# Altium footprint library PcbLib1.PcbLib: 48 footprints (part 1 of 3)
Each footprint in its own frame and in the unit in brackets; x right, y up, seen from the top. Pads: shape width x height; smd on the part's side, far side on the other; paste and mask are expansions set on the pad; w line width, h text height; cw(c..) or ccw(c..) is an arc to the next point about the centre after c.
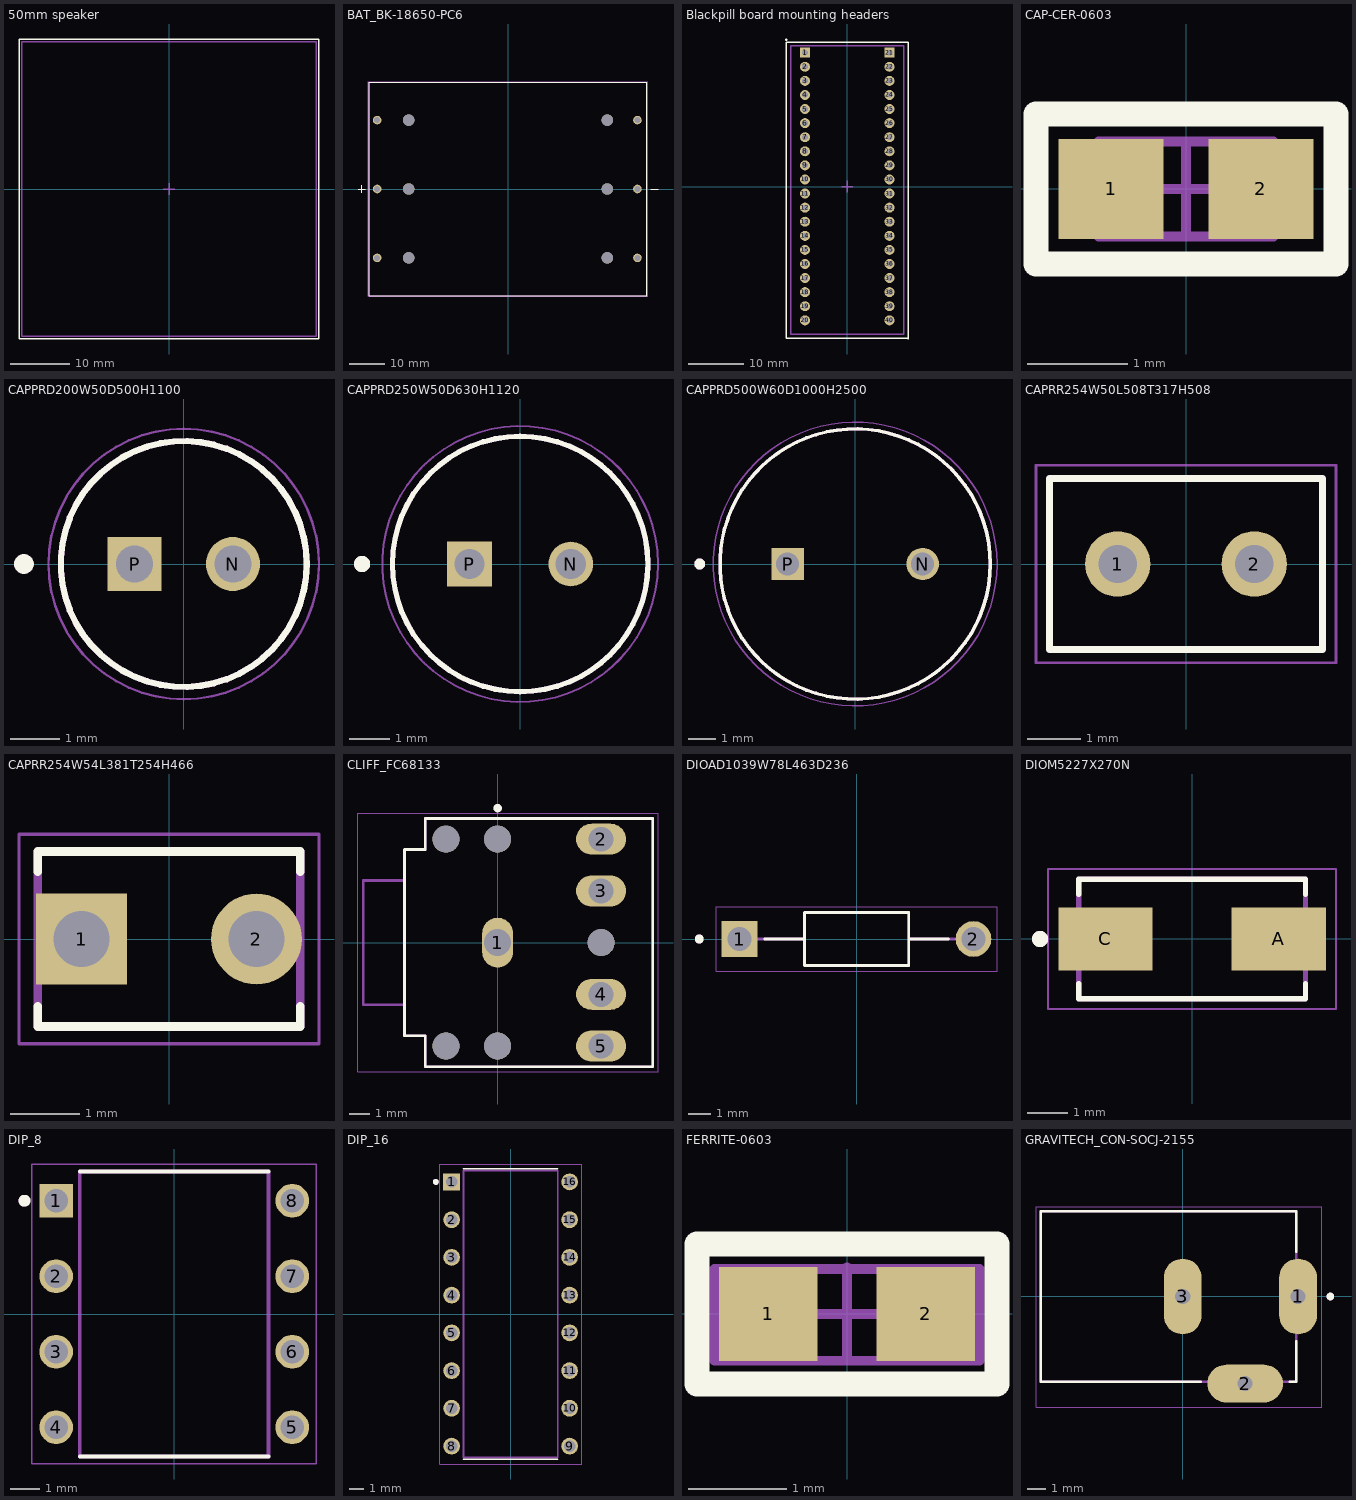
[diagram p0: the footprints below, top view; thin cyan lines are the x and y axes]

## 50mm speaker [mm]
Top Overlay:
  lines w0.254: -25.5,-25.5 25.5,-25.5 25.5,25.5 -25.5,25.5 -25.5,-25.5
Top Courtyard:
  lines w0.254: -1,0 1,0 ; 0,-1 0,1
Top 3D Body:
  lines w0.254: -25,-25 -25,25 25,25 25,-25 -25,-25
3D body "Aiyima speaker 50mm, 40Ohm, 5W.STEP": height 22, standoff -1.5, extent -25,-25 25,25

## BAT_BK-18650-PC6 [mm]
pads (12):
  round 2.4 hole 1.6: 1+(-36.65,19.3) 1-(36.25,19.3) 2+(-36.65,0) 2-(36.25,0) 3+(-36.65,-19.3) 3-(36.25,-19.3)
  round 3.2 hole 3.2 unplated: ""(-27.805,-19.3) ""(-27.805,0) ""(-27.805,19.3) ""(27.805,-19.3) ""(27.805,0) ""(27.805,19.3)
Top Overlay:
  lines w0.127: -42,0 -40,0 ; -41,-1 -41,1 ; 40,0 42,0 ; -38.85,-29.845 38.85,-29.845 38.85,29.845 -38.85,29.845 -38.85,-29.845
Mechanical 13:
  lines w0.127: -42,0 -40,0 ; -41,-1 -41,1 ; 40,0 42,0 ; -38.85,-29.845 38.85,-29.845 38.85,29.845 -38.85,29.845 -38.85,-29.845
Mechanical 15:
  lines w0.05: -39.1,-30.095 39.1,-30.095 39.1,30.095 -39.1,30.095 -39.1,-30.095
3D body "BK-18650-PC6--3DModel-STEP-56544.STEP": height 21.74, standoff -3, extent -38.723,-29.845 38.977,29.845

## Blackpill board mounting headers [mm]
pads (40):
  rect 1.8x1.8 hole 1: 1(-7.62,24.13) 21(7.62,24.13)
  round 1.8 hole 1: 2(-7.62,21.59) 3(-7.62,19.05) 4(-7.62,16.51) 5(-7.62,13.97) 6(-7.62,11.43) 7(-7.62,8.89) 8(-7.62,6.35) 9(-7.62,3.81) 10(-7.62,1.27) 11(-7.62,-1.27) 12(-7.62,-3.81) 13(-7.62,-6.35) 14(-7.62,-8.89) 15(-7.62,-11.43) 16(-7.62,-13.97) 17(-7.62,-16.51) 18(-7.62,-19.05) 19(-7.62,-21.59) 20(-7.62,-24.13) 22(7.62,21.59) 23(7.62,19.05) 24(7.62,16.51) 25(7.62,13.97) 26(7.62,11.43) 27(7.62,8.89) 28(7.62,6.35) 29(7.62,3.81) 30(7.62,1.27) 31(7.62,-1.27) 32(7.62,-3.81) 33(7.62,-6.35) 34(7.62,-8.89) 35(7.62,-11.43) 36(7.62,-13.97) 37(7.62,-16.51) 38(7.62,-19.05) 39(7.62,-21.59) 40(7.62,-24.13)
Top Overlay:
  circle w0.254: c-11,26.5 r0.1
  lines w0.254: -11,-27.4 10.9,-27.4 11,-27.5 11,25.9 10.9,26 -11,26 -11,-27.4
Top Assembly:
  lines w0.254: -10.16,-26.67 10.16,-26.67 10.16,25.4 -10.16,25.4 -10.16,-26.67
Top Courtyard:
  lines w0.254: -1,0 1,0 ; 0,-1 0,1
3D body "PPPC101LFBNRC--3DModel-STEP-269445.STEP": height 8.51, standoff -3.2, extent 6.35,-25.654 8.89,0.254
3D body "PPPC101LFBNRC--3DModel-STEP-269445.STEP": height 8.51, standoff -3.2, extent 6.35,-0.254 8.89,25.654
3D body "PPPC101LFBNRC--3DModel-STEP-269445.STEP": height 8.51, standoff -3.2, extent -8.89,-25.654 -6.35,0.254
3D body "PPPC101LFBNRC--3DModel-STEP-269445.STEP": height 8.51, standoff -3.2, extent -8.89,-0.254 -6.35,25.654

## CAP-CER-0603 [mm] "Chip Capacitor, 2-Leads, Body 1.60x0.80mm, IPC Medium Density"
height 0.95
pads (2):
  rect 1.05x1 smd: 1(-0.75,0) 2(0.75,0)
Top Overlay:
  lines w0.254: -1.5,-0.75 -1.5,0.75 1.5,0.75 1.5,-0.75 -1.5,-0.75
Top Assembly:
  lines w0.1: -0.875,-0.475 0.875,-0.475 0.875,0.475 -0.875,0.475 -0.875,-0.475
Top Courtyard:
  lines w0.05: -1.5,-0.75 1.5,-0.75 1.5,0.75 -1.5,0.75 -1.5,-0.75
  lines w0.1: -0.475,0 0.475,0 ; 0,-0.475 0,0.475
3D body "CAP-CER-0603.step": height 0.95, standoff 0, extent -0.875,-0.475 0.875,0.475

## CAPPRD200W50D500H1100 [mm]
pads (2):
  round 1.1 hole 0.75: N(1,0)
  rect 1.1x1.1 hole 0.75: P(-1,0)
Top Overlay:
  circle w0.2: c-3.25,0 r0.1
  circle w0.127: c0,0 r2.5
Mechanical 13:
  circle w0.2: c-3.25,0 r0.1
  circle w0.127: c0,0 r2.5
Mechanical 15:
  circle w0.05: c0,0 r2.75
3D body "step_temp.STEP": height 11, standoff -17, extent -2.5,-2.498 2.5,2.498

## CAPPRD250W50D630H1120 [mm]
pads (2):
  round 1.1 hole 0.75: N(1.25,0)
  rect 1.1x1.1 hole 0.75: P(-1.25,0)
Top Overlay:
  circle w0.127: c0,0 r3.15
  circle w0.2: c-3.9,0 r0.1
Mechanical 13:
  circle w0.127: c0,0 r3.15
  circle w0.2: c-3.9,0 r0.1
Mechanical 15:
  circle w0.05: c0,0 r3.4
3D body "step_temp.STEP": height 11.2, standoff -17, extent -3.15,-3.149 3.15,3.149

## CAPPRD500W60D1000H2500 [mm]
pads (2):
  round 1.2 hole 0.85: N(2.5,0)
  rect 1.2x1.2 hole 0.85: P(-2.5,0)
Top Overlay:
  circle w0.127: c0,0 r5
  circle w0.2: c-5.75,0 r0.1
Mechanical 13:
  circle w0.127: c0,0 r5
  circle w0.2: c-5.75,0 r0.1
Mechanical 15:
  circle w0.05: c0,0 r5.25
3D body "step_temp.STEP": height 25, standoff -17, extent -5,-4.999 5,4.999

## CAPRR254W50L508T317H508 [mm]
height 5.08
pads (2):
  round 1.218 hole 0.71 mask+0.102: 1(-1.27,0) 2(1.27,0)
Top Overlay:
  lines w0.127: -2.54,-1.587 2.54,-1.587 2.54,1.587 -2.54,1.587 -2.54,-1.587
Mechanical 13:
  lines w0.127: -2.54,-1.587 2.54,-1.587 2.54,1.587 -2.54,1.587 -2.54,-1.587
Mechanical 15:
  lines w0.05: -2.79,-1.837 2.79,-1.837 2.79,1.837 -2.79,1.837 -2.79,-1.837
3D body "step_temp.STEP": height 5.08, standoff -25.4, extent -2.54,-1.587 2.54,1.587

## CAPRR254W54L381T254H466 [mm]
height 4.66
pads (2):
  rect 1.318x1.318 / inner round 1.318 / far side rect 1.318x1.318 hole 0.81: 1(-1.27,0)
  round 1.318 hole 0.81: 2(1.27,0)
Top Overlay:
  lines w0.127: -1.905,-0.979 -1.905,-1.27 1.905,-1.27 1.905,-0.979 ; -1.905,0.979 -1.905,1.27 1.905,1.27 1.905,0.979
Mechanical 13:
  lines w0.127: -1.905,-1.27 1.905,-1.27 1.905,1.27 -1.905,1.27 -1.905,-1.27
Mechanical 15:
  lines w0.05: -2.179,-1.52 2.179,-1.52 2.179,1.52 -2.179,1.52 -2.179,-1.52
3D body "step_temp.STEP": height 4.66, standoff -7, extent -1.905,-1.27 1.905,1.27

## CLIFF_FC68133 [mm]
height 5.2
pads (10):
  oval 1.5x2.416 hole 1.3 mask+0.102: 1(0,0)
  oval 2.416x1.5 hole 1.2 mask+0.102: 2(5,5) 3(5,2.5) 4(5,-2.5) 5(5,-5)
  round 1.3 hole 1.3 unplated mask+0: ""(-2.5,-5) ""(-2.5,5) ""(0,-5) ""(0,5) ""(5,0)
Top Overlay:
  circle w0.2: c0,6.5 r0.1
  lines w0.127: -4.5,-4.5 -3.5,-4.5 -3.5,-6 7.5,-6 7.5,6 -3.5,6 -3.5,4.5 -4.5,4.5 -4.5,-4.5
Mechanical 13:
  circle w0.2: c0,6.5 r0.1
  lines w0.127: -4.5,-3 -6.5,-3 -6.5,3 -4.5,3 ; -4.5,-3 -4.5,3 ; -4.5,-3 -4.5,-4.5 -3.5,-4.5 -3.5,-6 7.5,-6 7.5,6 -3.5,6 -3.5,4.5 -4.5,4.5 -4.5,3
Mechanical 15:
  lines w0.05: -6.75,-6.25 -6.75,6.25 7.75,6.25 7.75,-6.25 -6.75,-6.25
3D body "step_temp.STEP": height 5.5, standoff -3.5, extent -6.5,-6 7.5,6

## DIOAD1039W78L463D236 [mm]
height 2.72
pads (2):
  rect 1.59x1.59 / inner round 1.59 / far side rect 1.59x1.59 hole 1.06: 1(-5.197,0)
  round 1.59 hole 1.06: 2(5.197,0)
Top Overlay:
  circle w0.2: c-6.992,0 r0.1
  lines w0.127: -4.082,0 -2.318,0 ; 4.082,0 2.318,0 ; -2.318,0 -2.318,1.18 2.318,1.18 2.318,0 ; -2.318,0 -2.318,-1.18 2.318,-1.18 2.318,0
Mechanical 13:
  circle w0.2: c-6.992,0 r0.1
  lines w0.127: -5.197,0 -2.318,0 ; 5.197,0 2.318,0 ; -2.318,0 -2.318,1.18 2.318,1.18 2.318,0 ; -2.318,0 -2.318,-1.18 2.318,-1.18 2.318,0
Mechanical 15:
  lines w0.05: -6.242,-1.43 -6.242,1.43 6.242,1.43 6.242,-1.43 -6.242,-1.43
3D body "step_temp.STEP": height 2.69, standoff -21.77, extent -5.474,-1.346 5.474,1.346

## DIOM5227X270N [mm]
height 2.7
pads (2):
  rect 2.33x1.56 smd paste+0 mask+0.102: A(2.14,0) C(-2.14,0)
Top Overlay:
  circle w0.2: c-3.755,0 r0.1
  lines w0.127: -2.8,-1.1 -2.8,-1.475 2.8,-1.475 2.8,-1.1 ; -2.8,1.1 -2.8,1.475 2.8,1.475 2.8,1.1
Mechanical 13:
  circle w0.2: c-3.755,0 r0.1
  lines w0.127: -2.8,-1.475 -2.8,1.475 2.8,1.475 2.8,-1.475 -2.8,-1.475
Mechanical 15:
  lines w0.05: -3.555,-1.725 3.555,-1.725 3.555,1.725 -3.555,1.725 -3.555,-1.725
3D body "S1M.STEP": height 2.5, standoff 0, extent -2.6,-1.362 2.6,1.362

## DIP_8 [mm]
pads (8):
  rect 1.13x1.13 / inner round 1.13 / far side rect 1.13x1.13 hole 0.78: 1(-3.97,3.81)
  round 1.13 hole 0.78: 2(-3.97,1.27) 3(-3.97,-1.27) 4(-3.97,-3.81) 5(3.97,-3.81) 6(3.97,-1.27) 7(3.97,1.27) 8(3.97,3.81)
Top Overlay:
  circle w0.2: c-5.035,3.81 r0.1
  lines w0.127: -3.175,-4.795 3.175,-4.795 ; -3.175,4.795 3.175,4.795
Mechanical 13:
  circle w0.2: c-5.035,3.81 r0.1
  lines w0.127: -3.175,-4.795 -3.175,4.795 3.175,4.795 3.175,-4.795 -3.175,-4.795
Mechanical 15:
  lines w0.05: -4.785,-5.045 -4.785,5.045 4.785,5.045 4.785,-5.045 -4.785,-5.045
3D body "step_temp.STEP": height 5.08, standoff -3, extent -4.153,-4.795 4.153,4.795

## DIP_16 [mm]
pads (16):
  rect 1.13x1.13 / inner round 1.13 / far side rect 1.13x1.13 hole 0.78: 1(-3.97,8.89)
  round 1.13 hole 0.78: 2(-3.97,6.35) 3(-3.97,3.81) 4(-3.97,1.27) 5(-3.97,-1.27) 6(-3.97,-3.81) 7(-3.97,-6.35) 8(-3.97,-8.89) 9(3.97,-8.89) 10(3.97,-6.35) 11(3.97,-3.81) 12(3.97,-1.27) 13(3.97,1.27) 14(3.97,3.81) 15(3.97,6.35) 16(3.97,8.89)
Top Overlay:
  circle w0.2: c-5.035,8.89 r0.1
  lines w0.127: -3.175,-9.775 3.175,-9.775 ; -3.175,9.775 3.175,9.775
Mechanical 13:
  circle w0.2: c-5.035,8.89 r0.1
  lines w0.127: -3.175,-9.653 -3.175,9.653 3.175,9.653 3.175,-9.653 -3.175,-9.653
Mechanical 15:
  lines w0.05: -4.785,-10.095 -4.785,10.095 4.785,10.095 4.785,-10.095 -4.785,-10.095
3D body "step_temp.STEP": height 5.08, standoff -3, extent -4.153,-9.653 4.153,9.653

## FERRITE-0603 [mm] "Chip Inductor, 2-Leads, Body 1.60x0.80mm, IPC Medium Density"
height 0.95
pads (2):
  rect 1x0.96 smd: 1(-0.8,0) 2(0.8,0)
Top Overlay:
  lines w0.254: -1.524,-0.711 1.524,-0.711 1.524,0.711 -1.524,0.711 -1.524,-0.711
Top Assembly:
  lines w0.1: -1.346,-0.475 1.346,-0.475 1.346,0.457 -1.346,0.457 -1.346,-0.475
Top Courtyard:
  lines w0.05: -1.5,-0.75 1.5,-0.75 1.5,0.75 -1.5,0.75 -1.5,-0.75
  lines w0.1: -0.475,0 0.475,0 ; 0,-0.475 0,0.475
3D body "FERRITE_0603.step": height 0.95, standoff 0, extent -0.875,-0.475 0.875,0.475

## GRAVITECH_CON-SOCJ-2155 [mm]
height 11.1
pads (3):
  oval 2x4 hole 0.8 square: 1(6.1,0) 3(0,0)
  oval 4x2 hole 0.8 square: 2(3.3,-4.6)
Top Overlay:
  circle w0.2: c7.8,0 r0.1
  lines w0.127: 0.95,-4.5 -7.5,-4.5 -7.5,4.5 6,4.5 6,2.35 ; 5.65,-4.5 6,-4.5 6,-2.35
Mechanical 13:
  circle w0.2: c7.8,0 r0.1
  lines w0.127: -7.5,-4.5 6,-4.5 6,4.5 -7.5,4.5 -7.5,-4.5
Mechanical 15:
  lines w0.05: -7.75,-5.85 7.35,-5.85 7.35,4.75 -7.75,4.75 -7.75,-5.85
3D body "step_temp.STEP": height 11.1, standoff -4.3, extent -7.512,-4.75 6.588,4.5